# Altium footprint library MyPcbLib.PcbLib: 278 footprints (part 7 of 18)
Each footprint in its own frame and in the unit in brackets; x right, y up, seen from the top. Pads: shape width x height; smd on the part's side, far side on the other; paste and mask are expansions set on the pad; w line width, h text height; cw(c..) or ccw(c..) is an arc to the next point about the centre after c.
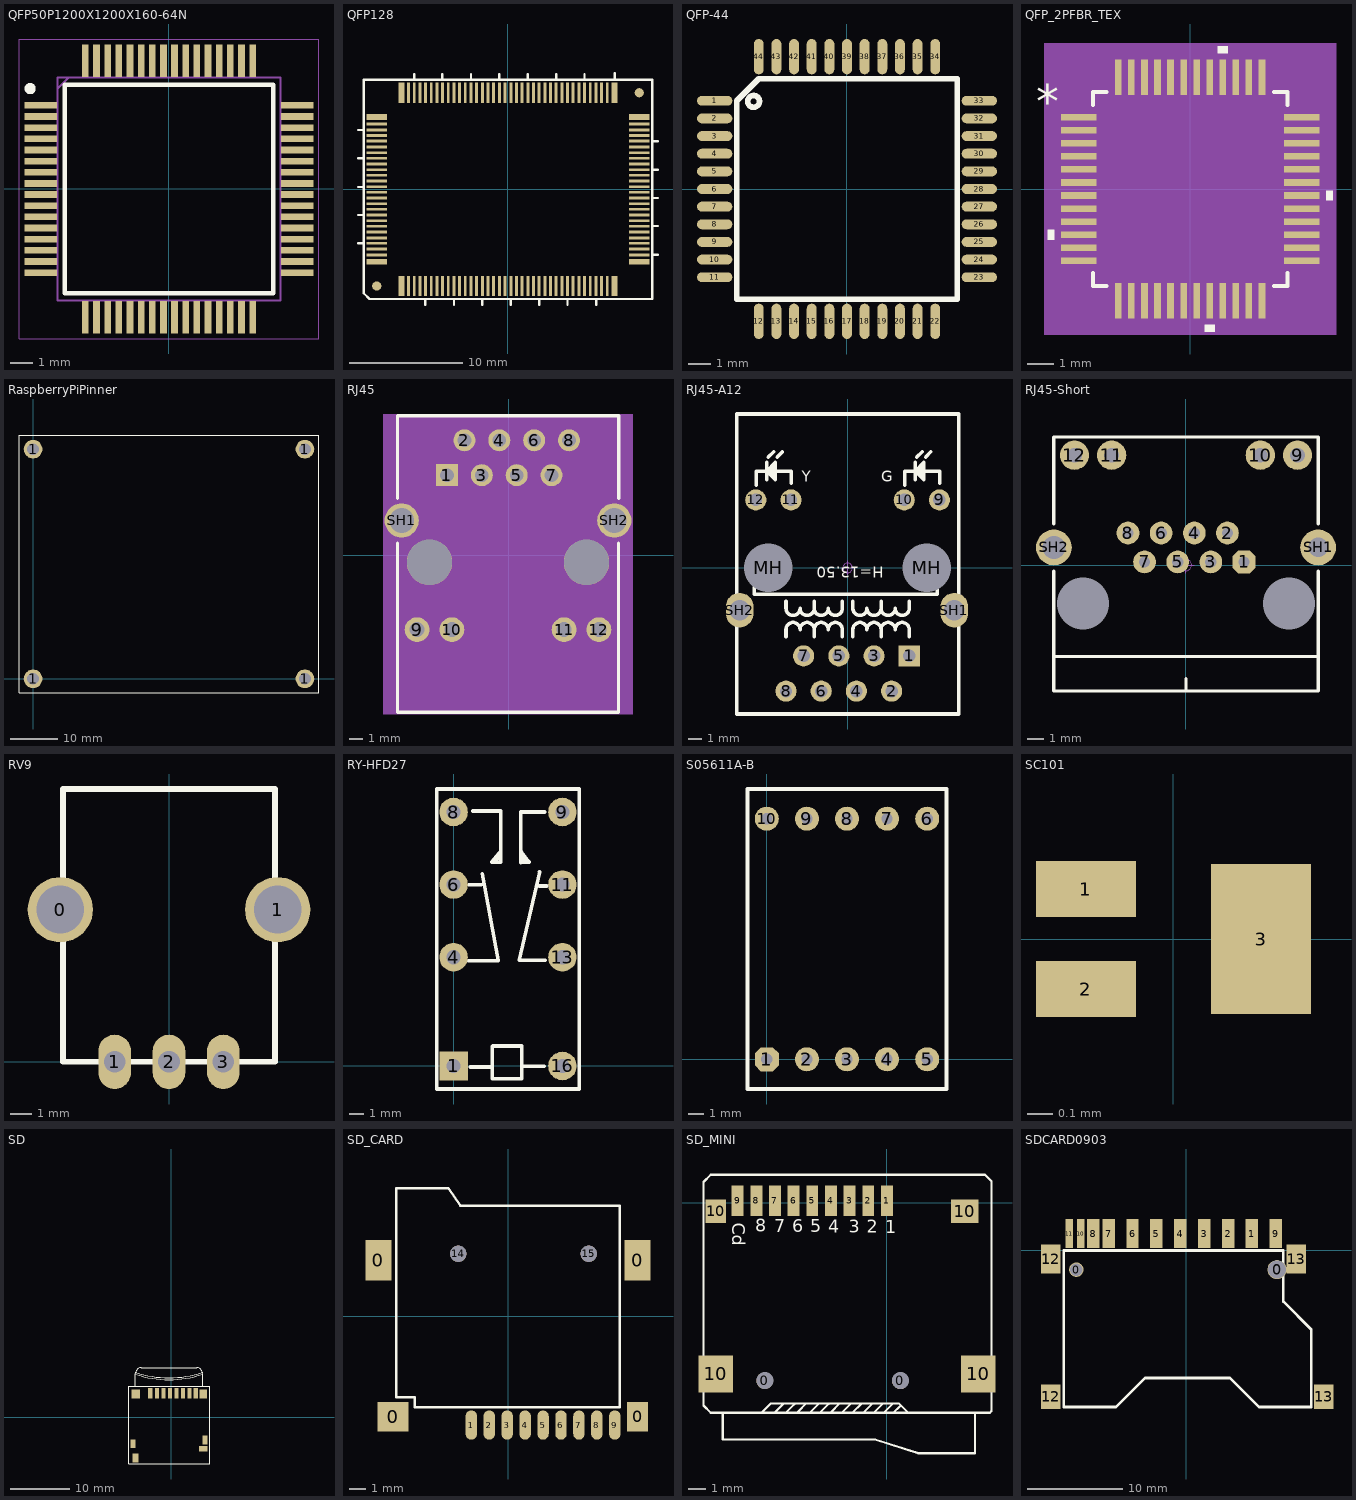
[diagram p6: the footprints below, top view; thin cyan lines are the x and y axes]

## QFP50P1200X1200X160-64N [mm]
height 3
pads (64):
  rect 1.45x0.3 smd: 1(-5.75,3.75) 2(-5.75,3.25) 3(-5.75,2.75) 4(-5.75,2.25) 5(-5.75,1.75) 6(-5.75,1.25) 7(-5.75,0.75) 8(-5.75,0.25) 9(-5.75,-0.25) 10(-5.75,-0.75) 11(-5.75,-1.25) 12(-5.75,-1.75) 13(-5.75,-2.25) 14(-5.75,-2.75) 15(-5.75,-3.25) 16(-5.75,-3.75) 33(5.75,-3.75) 34(5.75,-3.25) 35(5.75,-2.75) 36(5.75,-2.25) 37(5.75,-1.75) 38(5.75,-1.25) 39(5.75,-0.75) 40(5.75,-0.25) 41(5.75,0.25) 42(5.75,0.75) 43(5.75,1.25) 44(5.75,1.75) 45(5.75,2.25) 46(5.75,2.75) 47(5.75,3.25) 48(5.75,3.75)
  rect 0.3x1.45 smd: 17(-3.75,-5.75) 18(-3.25,-5.75) 19(-2.75,-5.75) 20(-2.25,-5.75) 21(-1.75,-5.75) 22(-1.25,-5.75) 23(-0.75,-5.75) 24(-0.25,-5.75) 25(0.25,-5.75) 26(0.75,-5.75) 27(1.25,-5.75) 28(1.75,-5.75) 29(2.25,-5.75) 30(2.75,-5.75) 31(3.25,-5.75) 32(3.75,-5.75) 49(3.75,5.75) 50(3.25,5.75) 51(2.75,5.75) 52(2.25,5.75) 53(1.75,5.75) 54(1.25,5.75) 55(0.75,5.75) 56(0.25,5.75) 57(-0.25,5.75) 58(-0.75,5.75) 59(-1.25,5.75) 60(-1.75,5.75) 61(-2.25,5.75) 62(-2.75,5.75) 63(-3.25,5.75) 64(-3.75,5.75)
Top Overlay:
  circle w0.25: c-6.225,4.5 r0.125
  lines w0.2: -4.675,-4.675 4.675,-4.675 4.675,4.675 -4.675,4.675 -4.675,-4.675
Mechanical 13:
  lines w0.1: -5,4.5 -4.5,5 ; -5,-5 5,-5 5,5 -5,5 -5,-5
Mechanical 15:
  lines w0.05: -6.725,-6.725 6.725,-6.725 6.725,6.725 -6.725,6.725 -6.725,-6.725
3D body "STM32F401RBT6.stp": height 1.6, standoff 0, extent -6,-6 6,6

## QFP128 [mil]
pads (130):
  rect 20x70 smd: 1(-369,-335) 38(369,-335) 65(369,335) 102(-369,335)
  rect 10x70 smd: 2(-345,-335) 3(-325,-335) 4(-305,-335) 5(-286,-335) 6(-266,-335) 7(-246,-335) 8(-227,-335) 9(-207,-335) 10(-187,-335) 11(-168,-335) 12(-148,-335) 13(-128,-335) 14(-109,-335) 15(-89,-335) 16(-69,-335) 17(-50,-335) 18(-30,-335) 19(-10,-335) 20(10,-335) 21(29,-335) 22(49,-335) 23(69,-335) 24(88,-335) 25(108,-335) 26(128,-335) 27(147,-335) 28(167,-335) 29(187,-335) 30(206,-335) 31(226,-335) 32(246,-335) 33(265,-335) 34(285,-335) 35(305,-335) 36(324,-335) 37(344,-335) 66(344,335) 67(324,335) 68(305,335) 69(285,335) 70(265,335) 71(246,335) 72(226,335) 73(206,335) 74(187,335) 75(167,335) 76(147,335) 77(128,335) 78(108,335) 79(88,335) 80(69,335) 81(49,335) 82(29,335) 83(10,335) 84(-10,335) 85(-30,335) 86(-50,335) 87(-69,335) 88(-89,335) 89(-109,335) 90(-128,335) 91(-148,335) 92(-168,335) 93(-187,335) 94(-207,335) 95(-227,335) 96(-246,335) 97(-266,335) 98(-286,335) 99(-305,335) 100(-325,335) 101(-345,335)
  rect 70x20 smd: 39(455,-251) 64(455,251) 103(-455,251) 128(-455,-251)
  rect 70x10 smd: 40(455,-227) 41(455,-207) 42(455,-187) 43(455,-168) 44(455,-148) 45(455,-128) 46(455,-109) 47(455,-89) 48(455,-69) 49(455,-50) 50(455,-30) 51(455,-10) 52(455,9) 53(455,29) 54(455,49) 55(455,68) 56(455,88) 57(455,108) 58(455,127) 59(455,147) 60(455,167) 61(455,187) 62(455,206) 63(455,226) 104(-455,226) 105(-455,206) 106(-455,187) 107(-455,167) 108(-455,147) 109(-455,127) 110(-455,108) 111(-455,88) 112(-455,68) 113(-455,49) 114(-455,29) 115(-455,9) 116(-455,-10) 117(-455,-30) 118(-455,-50) 119(-455,-69) 120(-455,-89) 121(-455,-109) 122(-455,-128) 123(-455,-148) 124(-455,-168) 125(-455,-187) 126(-455,-207) 127(-455,-227)
  round 32 smd: 129(-455,-335) 130(455,335)
Top Overlay:
  lines w8: -520,-187 -500,-187 ; -520,-89 -500,-89 ; -520,8 -500,8 ; -520,108 -500,108 ; -520,205.5 -500,205.5 ; -325,380 -325,400 ; -287,-400 -287,-380 ; -227.5,380 -227.5,400 ; -187,-400 -187,-380 ; -128,380 -128,400 ; -89.5,-400 -89.5,-380 ; -30,380 -30,400 ; 10,-400 10,-380 ; 69,380 69,400 ; 108,-400 108,-380 ; 167.5,380 167.5,400 ; 206,-400 206,-380 ; 265,380 265,400 ; 305.5,-400 305.5,-380 ; 370,382.5 370,402.5 ; 500,-227 520,-227 ; 500,-127 520,-127 ; 500,-30 520,-30 ; 500,68 520,68 ; 500,167 520,167 ; -500,-360 -480,-380 500,-380 500,380 -500,380 -500,-360
3D body "User Library-QFP5-128.step": height 114.17, standoff 0, extent -457.39,-339.17 456,338

## QFP-44 [mm]
pads (44):
  oval 1.6x0.45 smd: 1(-6,4) 2(-6,3.2) 3(-6,2.4) 4(-6,1.6) 5(-6,0.8) 6(-6,0) 7(-6,-0.8) 8(-6,-1.6) 9(-6,-2.4) 10(-6,-3.2) 11(-6,-4) 23(6,-4) 24(6,-3.2) 25(6,-2.4) 26(6,-1.6) 27(6,-0.8) 28(6,0) 29(6,0.8) 30(6,1.6) 31(6,2.4) 32(6,3.2) 33(6,4)
  oval 0.45x1.6 smd: 12(-4,-6) 13(-3.2,-6) 14(-2.4,-6) 15(-1.6,-6) 16(-0.8,-6) 17(0,-6) 18(0.8,-6) 19(1.6,-6) 20(2.4,-6) 21(3.2,-6) 22(4,-6) 34(4,6) 35(3.2,6) 36(2.4,6) 37(1.6,6) 38(0.8,6) 39(0,6) 40(-0.8,6) 41(-1.6,6) 42(-2.4,6) 43(-3.2,6) 44(-4,6)
Top Overlay:
  circle w0.254: c-4.232,3.972 r0.267
  lines w0.254: -5,-5 -5,4 -4,5 5,5 5,-5 -5,-5
3D body: height 1.15, standoff 0, extent -4.484,3.489 -3.488,4.487
3D body "User Library-44 pin tqfp ic package.STEP": height 1.1, standoff -0.01, extent -5.975,-5.975 6.025,6.025

## QFP_2PFBR_TEX [mil]
pads (48):
  rect 53.5x10 smd paste+0 mask+0: 1(-168.25,108.3) 2(-168.25,88.61) 3(-168.25,68.92) 4(-168.25,49.23) 5(-168.25,29.54) 6(-168.25,9.85) 7(-168.25,-9.85) 8(-168.25,-29.54) 9(-168.25,-49.23) 10(-168.25,-68.92) 11(-168.25,-88.61) 12(-168.25,-108.3) 25(168.25,-108.3) 26(168.25,-88.61) 27(168.25,-68.92) 28(168.25,-49.23) 29(168.25,-29.54) 30(168.25,-9.85) 31(168.25,9.85) 32(168.25,29.54) 33(168.25,49.23) 34(168.25,68.92) 35(168.25,88.61) 36(168.25,108.3)
  rect 10x53.5 smd paste+0 mask+0: 13(-108.3,-168.25) 14(-88.61,-168.25) 15(-68.92,-168.25) 16(-49.23,-168.25) 17(-29.54,-168.25) 18(-9.85,-168.25) 19(9.85,-168.25) 20(29.54,-168.25) 21(49.23,-168.25) 22(68.92,-168.25) 23(88.61,-168.25) 24(108.3,-168.25) 37(108.3,168.25) 38(88.61,168.25) 39(68.92,168.25) 40(49.23,168.25) 41(29.54,168.25) 42(9.85,168.25) 43(-9.85,168.25) 44(-29.54,168.25) 45(-49.23,168.25) 46(-68.92,168.25) 47(-88.61,168.25) 48(-108.3,168.25)
Top Overlay:
  region: -205,-61.41 -215,-61.41 -215,-76.42 -205,-76.42
  region: 37.03,-205 22.04,-205 22.04,-215 37.03,-215
  region: 205,-2.35 215,-2.35 215,-17.34 205,-17.34
  region: 56.73,205 41.73,205 41.73,215 56.73,215
  lines w6: -146.5,-126.39 -146.5,-146.5 -126.39,-146.5 ; -146.5,126.39 -146.5,146.5 -126.39,146.5 ; 126.39,-146.5 146.5,-146.5 146.5,-126.39 ; 126.39,146.5 146.5,146.5 146.5,126.39
  text "*" at -232.5,108.14 h50
Mechanical 5:
  region: 220,-220 -220,-220 -220,220 220,220
Mechanical 13:
  drawing of 197 lines, arcs and shapes, not listed
  text "*" at -139,93.14 h50
Mechanical 15:
  region: -123.3,-151.5 -151.5,-151.5 -151.5,-123.3 -205,-123.3 -205,123.3 -151.5,123.3 -151.5,151.5 -123.3,151.5 -123.3,205 123.3,205 123.3,151.5 151.5,151.5 151.5,123.3 205,123.3 205,-123.3 151.5,-123.3 151.5,-151.5 123.3,-151.5 123.3,-205 -123.3,-205
  lines w6: -205,-123.3 -151.5,-123.3 -151.5,-151.5 -123.3,-151.5 -123.3,-205 123.3,-205 123.3,-151.5 151.5,-151.5 151.5,-123.3 205,-123.3 205,123.3 151.5,123.3 151.5,151.5 123.3,151.5 123.3,205 -123.3,205 -123.3,151.5 -151.5,151.5 -151.5,123.3 -205,123.3 -205,-123.3
3D body "QFP_2PFBR_TEX.step": height 47.09, standoff 0, extent -180.98,-180.98 180.99,180.99

## RaspberryPiPinner [mm] "树莓派定位孔"
pads (4):
  round 4 hole 2.5: 1(0,0) 1(0,49) 1(58,0) 1(58,49)
Top Overlay:
  lines w0.254: -3,-3 -3,52 61,52 61,-3 0,-3 -3,-3

## RJ45 [mm]
pads (16):
  rect 1.6x1.6 hole 1: 1(-4.496,5.84)
  round 1.6 hole 1: 2(-3.226,8.38) 3(-1.956,5.84) 4(-0.686,8.38) 5(0.584,5.84) 6(1.854,8.38) 7(3.124,5.84) 8(4.394,8.38)
  round 1.8 hole 1.1: 9(-6.676,-5.41) 10(-4.136,-5.41) 11(4.034,-5.41) 12(6.574,-5.41)
  round 2.5 hole 1.8: SH1(-7.796,2.54) SH2(7.694,2.54)
  round 3.3 hole 3.3 unplated: ""(-5.766,-0.51) ""(5.664,-0.51)
Top Overlay:
  lines w0.254: -8.101,0.87 -8.101,-11.43 7.999,-11.43 7.999,0.87 ; -8.101,4.17 -8.101,10.17 7.999,10.17 8,4.17
Mechanical 4:
  circle w1.65: c5.664,-0.51 r0.825
  circle w1.65: c-5.766,-0.51 r0.825
  region: -9.144,10.297 9.042,10.297 9.042,-11.557 -9.144,-11.557
Mechanical 5:
  circle w0.127: c5.664,-0.51 r1.65
  circle w0.127: c-5.766,-0.51 r1.65
  region: 6.444,3.79 8.944,3.79 8.944,1.29 6.444,1.29
  region: -9.046,3.79 -6.546,3.79 -6.546,1.29 -9.046,1.29
  region: 5.674,-4.51 7.474,-4.51 7.474,-6.31 5.674,-6.31
  region: 3.134,-4.51 4.934,-4.51 4.934,-6.31 3.134,-6.31
  region: -5.036,-4.51 -3.236,-4.51 -3.236,-6.31 -5.036,-6.31
  region: -7.576,-4.51 -5.776,-4.51 -5.776,-6.31 -7.576,-6.31
  region: 3.594,9.18 5.194,9.18 5.194,7.58 3.594,7.58
  region: 2.324,6.64 3.924,6.64 3.924,5.04 2.324,5.04
  region: 1.054,9.18 2.654,9.18 2.654,7.58 1.054,7.58
  region: -0.216,6.64 1.384,6.64 1.384,5.04 -0.216,5.04
  region: -1.486,9.18 0.114,9.18 0.114,7.58 -1.486,7.58
  region: -2.756,6.64 -1.156,6.64 -1.156,5.04 -2.756,5.04
  region: -4.026,9.18 -2.426,9.18 -2.426,7.58 -4.026,7.58
  region: -5.296,6.64 -3.696,6.64 -3.696,5.04 -5.296,5.04
Mechanical 15:
  lines w0.003: -0.076,0.215 -0.025,0.265

## RJ45-A12 [mil] "网线接口"
height 665.35
pads (16):
  rect 60x60 hole 35.43: 1(175,-250)
  round 60 hole 35.43: 2(125,-350) 3(75,-250) 4(25,-350) 5(-25,-250) 6(-75,-350) 7(-125,-250) 8(-175,-350) 9(260.83,192.91) 10(160.83,192.91) 11(-160.82,192.91) 12(-260.82,192.91)
  round 130 hole 137.8: MH(-225,0) MH(225,0)
  oval 78.74x98.43 hole 59.06: SH1(302.96,-120.08) SH2(-306.49,-120.08)
Top Overlay:
  lines w9.84: -260,234.8 -260,274.8 -160,274.8 -160,239.8 ; -230,249.8 -230,299.8 ; -225,314.8 -210,329.8 ; -213.92,259.34 -213.92,290.88 ; -200,314.8 -185,329.8 ; 161.65,234.8 161.65,274.8 261.65,274.8 261.65,239.8 ; 191.65,249.8 191.65,299.8 ; 196.65,314.8 211.65,329.8 ; 207.73,259.34 207.73,290.88 ; 221.65,314.8 236.65,329.8 ; -230,274.8 -205,299.8 -205,249.8 -230,274.8 ; 191.65,274.8 216.65,299.8 216.65,249.8 191.65,274.8
  lines w10: -265,-55 -265,-75 255,-75 255,-55 ; -175,-195 -175,-175 cw(c-155,-175) -135,-175 cw(c-115,-175) -95,-175 ; -175,-95 -175,-115 ccw(c-155,-115) -135,-115 ccw(c-115,-115) -95,-115 ; -95,-195 -95,-175 ; -95,-95 -95,-115 ; -15,-195 -15,-175 ccw(c-35,-175) -55,-175 ccw(c-75,-175) -95,-175 ; -15,-95 -15,-115 cw(c-35,-115) -55,-115 cw(c-75,-115) -95,-115 ; 15,-195 15,-175 cw(c35,-175) 55,-175 cw(c75,-175) 95,-175 ; 15,-95 15,-115 ccw(c35,-115) 55,-115 ccw(c75,-115) 95,-115 ; 95,-195 95,-175 ; 95,-95 95,-115 ; 175,-195 175,-175 ccw(c155,-175) 135,-175 ccw(c115,-175) 95,-175 ; 175,-95 175,-115 cw(c155,-115) 135,-115 cw(c115,-115) 95,-115 ; -315,-415 315,-415 315,437.01 -315,437.01 -315,-415
  text "G" at 95,244.8 h31.5
  text "Y" at -130,244.8 h31.5
  text "H=13.50" at 101.94,3.75 h31.5
Mechanical 15:
  circle w1.97: c0,0 r13.78
  lines w1.97: -19.69,0 19.68,0 ; 0,-19.68 0,19.69
3D body "HanRun-HR911105A.STEP": height 59.06, standoff -590.55, extent -311.37,-412.34 313.83,430.18

## RJ45-Short [mm] "RJ45屏蔽网络插座带LED"
height 16.9
pads (16):
  oct 1.4x1.4 hole 0.7: 1(3.57,0.19)
  round 1.4 hole 0.7: 2(2.55,1.97) 3(1.53,0.19) 4(0.51,1.97) 5(-0.51,0.19) 6(-1.53,1.97) 7(-2.55,0.19) 8(-3.57,1.97)
  round 0 hole 3.2 unplated: 9(-6.35,-2.363) 10(6.35,-2.363)
  round 1.8 hole 0.9 unplated: 9(6.86,6.757) 10(4.57,6.757) 11(-4.57,6.757) 12(-6.86,6.757)
  round 2.2 hole 1.2: SH1(8.128,1.08)
  round 2.2 hole 1.4: SH2(-8.128,1.08)
Top Overlay:
  lines w0.203: -8.128,-5.626 8.128,-5.626 ; -8.128,-0.381 -8.128,-7.747 8.128,-7.747 8.128,-0.381 ; 0,-7.747 0,-6.985 ; -8.128,2.54 -8.128,2.54 ; -8.128,2.54 -8.128,7.874 8.128,7.874 8.128,2.54 ; 8.128,2.54 8.128,2.54
Mechanical 15:
  circle w0.05: c0,0 r0.35
  lines w0.05: -0.5,0 0.5,0 ; 0,-0.5 0,0.5
3D body "RJ45-2LED.STEP": height 12.85, standoff -2.95, extent -7.95,-7.65 7.95,7.75

## RV9 [mm]
pads (5):
  round 3 hole 2.2: 0(-5,7) 1(5,7)
  oval 1.5x2.5 hole 1: 1(-2.5,0) 2(0,0) 3(2.5,0)
Top Overlay:
  lines w0.254: -4.876,0 -4.876,12.55 4.876,12.55 4.876,0 -4.876,0
3D body "User Library-RV09ACF-40_RK09K1130A5R.step": height 20, standoff -3.8, extent -4.876,0 4.876,12.55

## RY-HFD27 [mm]
pads (8):
  rect 2x2 hole 1: 1(0,0)
  round 2 hole 1: 4(0,7.62) 6(0,12.7) 8(0,17.78) 9(7.62,17.78) 11(7.62,12.7) 13(7.62,7.62) 16(7.62,0)
Top Overlay:
  lines w0.254: 1.022,7.375 3.128,7.375 2.004,13.46 ; 1.058,12.693 1.932,12.693 ; 1.183,-0.066 2.629,-0.066 ; 1.344,17.85 3.307,17.85 3.306,14.263 2.664,14.263 3.217,14.923 3.021,14.406 ; 4.734,15.013 5.287,14.281 5.269,14.263 4.698,14.245 4.699,17.779 6.394,17.779 ; 4.805,14.781 4.966,14.352 ; 4.877,-0.013 6.34,-0.013 ; 6.001,12.604 6.519,12.604 ; 6.019,13.585 4.609,7.411 6.429,7.411 ; -1.19,-1.61 -1.19,19.39 8.81,19.39 8.81,-1.61 -1.19,-1.61 ; 2.7,-0.887 4.752,-0.887 4.77,-0.869 4.77,1.397 2.736,1.397 2.7,1.361 2.7,1.076 2.7,-0.887
3D body "User Library-OMRON G5V-2.STEP": height 10.92, standoff -4, extent -1.143,-1.27 8.857,19.13

## S05611A-B [mil]
pads (10):
  oct 60x60 hole 28: 1(0,0)
  round 60 hole 28: 2(100,0) 3(200,0) 4(300,0) 5(400,0) 6(400,600) 7(300,600) 8(200,600) 9(100,600) 10(0,600)
Top Overlay:
  lines w10: -48.03,-74.02 -48.03,674.02 448.03,674.02 448.03,-74.02 -48.03,-74.02
  text ".56'" at 100,280 h60
3D body "S5611A-B.STEP": height 316.25, standoff -156.19, extent -50,-75 450,675

## SC101 [mm]
height 0.5
pads (3):
  rect 0.4x0.225 smd: 1(-0.35,0.2) 2(-0.35,-0.2)
  rect 0.4x0.6 smd: 3(0.35,0)
3D body "SC101.STEP": height 0.5, standoff 0, extent -0.519,-0.32 0.521,0.32

## SD [mm]
pads (14):
  rect 0.7x1.75 smd: P$1(-3.509,4.048) P$2(-2.409,4.048) P$3(-1.309,4.048) P$4(-0.209,4.048) P$5(0.891,4.048) P$6(1.991,4.048) P$7(3.091,4.048) P$8(4.151,4.048)
  rect 1.5x1.5 smd: P$9(-5.959,3.948)
  rect 1.3x1.5 smd: P$10(5.391,3.948)
  rect 0.8x1.5 smd: P$11(5.691,-3.802)
  rect 1.45x1 smd: P$12(5.391,-5.302)
  rect 0.8x1.4 smd: P$13(-6.409,-4.452)
  rect 1x1.55 smd: P$14(-6.009,-6.852)
Top Overlay:
  lines w0.127: -6.009,5.207 -6.009,7.248 -6.009,7.348 cw(c-5.009,7.348) -5.009,8.348 4.291,8.348 cw(c4.291,7.348) 5.291,7.348 5.291,7.248 ; -6.009,7.248 ccw(c-0.359,24.348) 5.291,7.248 ; -6.009,7.548 ccw(c-0.359,24.648) 5.291,7.548 ; 5.291,5.207 5.291,7.248 ; -7.112,-7.874 -7.112,5.207 6.477,5.207 6.477,-7.874 -7.112,-7.874
3D body "MicroSD.STEP": height 1.85, standoff -0.05, extent -7.515,-7.86 6.735,7.34

## SD_CARD [mm]
pads (15):
  rect 1.6x2.5 smd: 0(-7.953,3.429) 0(7.947,3.429)
  rect 1.9x1.8 smd: 0(-7.053,-6.171)
  rect 1.3x1.8 smd: 0(7.947,-6.171)
  oval 0.7x1.8 smd: 1(-2.253,-6.671) 2(-1.153,-6.671) 3(-0.053,-6.671) 4(1.047,-6.671) 5(2.147,-6.671) 6(3.247,-6.671) 7(4.347,-6.671) 8(5.447,-6.671) 9(6.547,-6.671)
  round 1 hole 1: 14(-3.053,3.829) 15(4.947,3.829)
Top Overlay:
  lines w0.152: -6.858,-4.953 -5.715,-4.953 -5.715,-5.588 -5.08,-5.588 6.401,-5.588 6.858,-5.588 6.858,6.782 -2.921,6.782 -3.658,7.849 -6.858,7.849 -6.858,-4.572 -6.858,-4.953
3D body "SDcard.STEP": height 2.05, standoff -0.4, extent -8,-7.4 8,7.85

## SD_MINI [mm]
pads (15):
  round 1 hole 1 unplated: 0(-7.2,-10.5) 0(0.8,-10.5)
  rect 0.7x1.8 smd: 1(0,0.127) 2(-1.1,0.127) 3(-2.2,0.127) 4(-3.3,0.127) 5(-4.4,0.127) 6(-5.5,0.127) 7(-6.6,0.127) 8(-7.7,0.127) 9(-8.8,0.127)
  rect 2.032x2.2 smd: 10(-10.1,-10.1) 10(5.4,-10.1)
  rect 1.2x1.4 smd: 10(-10.1,-0.5)
  rect 1.6x1.4 smd: 10(4.6,-0.5)
Top Overlay:
  lines w0.127: -9.677,-12.395 -9.677,-13.97 -0.686,-13.97 ; -6.629,-12.395 -6.096,-11.862 -6.096,-11.836 ; -5.969,-12.395 -5.461,-11.887 -5.461,-11.836 ; -5.232,-12.395 -5.232,-12.319 -4.75,-11.836 ; -4.547,-12.395 -3.988,-11.836 -3.962,-11.836 ; -3.962,-12.395 -3.429,-11.862 -3.429,-11.836 ; -3.327,-12.395 -2.769,-11.836 -2.667,-11.836 ; -2.667,-12.395 -2.108,-11.836 -2.083,-11.836 ; -2.032,-12.395 -1.499,-11.862 -1.499,-11.836 ; -1.397,-12.395 -0.838,-11.836 -0.711,-11.836 ; -0.762,-12.395 -0.203,-11.836 -0.178,-11.836 ; -0.711,-13.97 1.854,-14.783 5.207,-14.783 5.207,-12.421 ; -0.178,-12.395 0.381,-11.836 ; 0.381,-12.395 0.787,-11.989 0.864,-11.989 ; -10.389,-12.395 -7.391,-12.395 -6.833,-11.836 0.711,-11.836 1.27,-12.395 6.071,-12.395 ; -10.389,-12.395 6.071,-12.395 ; -10.389,-12.395 -10.82,-11.963 -10.82,1.219 -10.389,1.651 5.791,1.651 6.172,1.27 6.172,-12.294 6.071,-12.395
  text "1" at -0.102,-1.803 h0.76
  text "2" at -1.194,-1.778 h0.76
  text "3" at -2.261,-1.778 h0.76
  text "4" at -3.454,-1.778 h0.76
  text "5" at -4.521,-1.753 h0.76
  text "6" at -5.588,-1.753 h0.76
  text "7" at -6.655,-1.753 h0.76
  text "8" at -7.772,-1.727 h0.76
  text "Cd" at -9.119,-1.168 h0.76
3D body "sdcard.STEP": height 1.8, standoff -0.7, extent -10.372,-14.725 5.901,0.469

## SDCARD0903 [mm] "SD卡插座0903"
pads (17):
  round 1.524 hole 1.321: 0(-11.5,-2)
  round 2 hole 1.9: 0(9.5,-2)
  rect 1.3x3 smd: 1(6.875,1.778) 2(4.375,1.778) 3(1.875,1.778) 4(-0.625,1.778) 5(-3.125,1.778) 6(-5.625,1.778) 7(-8.125,1.778) 8(-9.75,1.778) 9(9.375,1.778)
  rect 0.762x3 smd: 10(-11.05,1.778) 11(-12.25,1.778)
  rect 2.032x2.54 smd: 12(-14.2,-15.3) 13(14.4,-15.3)
  rect 2.032x3.048 smd: 12(-14.2,-0.9) 13(11.5,-0.9)
Top Overlay:
  lines w0.279: -12.827,-16.383 -12.827,0 10.16,0 10.16,-5.334 13.081,-8.255 13.081,-16.383 7.62,-16.383 4.572,-13.335 0,-13.335 -4.318,-13.335 -7.366,-16.383 -12.827,-16.383
3D body "SD Kart.step": height 3, standoff -1, extent -14.224,-28.564 14.376,1.436